# Altium footprint library Altium_Lib.PcbLib: 334 footprints (part 7 of 21)
Each footprint in its own frame and in the unit in brackets; x right, y up, seen from the top. Pads: shape width x height; smd on the part's side, far side on the other; paste and mask are expansions set on the pad; w line width, h text height; cw(c..) or ccw(c..) is an arc to the next point about the centre after c.
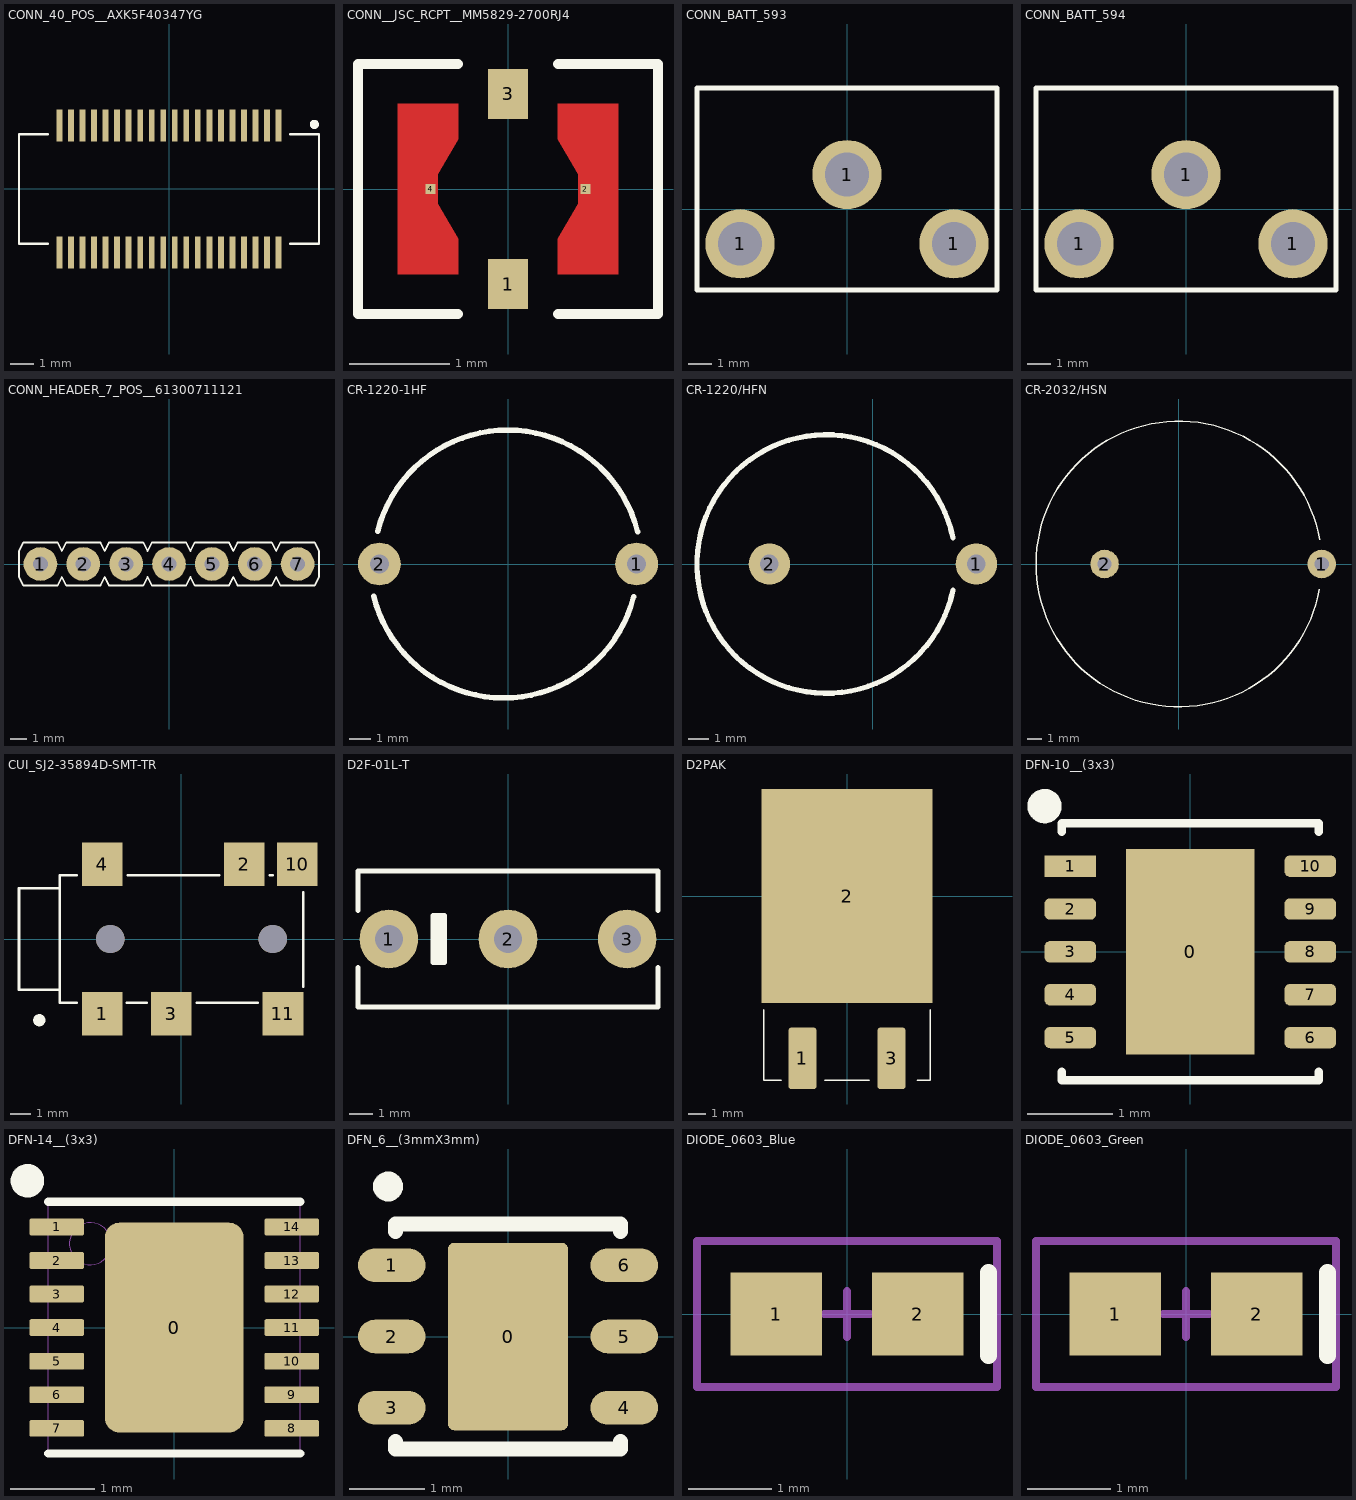
[diagram p6: the footprints below, top view; thin cyan lines are the x and y axes]

## CONN_40_POS__AXK5F40347YG [mm]
pads (40):
  rect 0.25x1.4 smd: 1(4.75,2.75) 2(4.25,2.75) 3(3.75,2.75) 4(3.25,2.75) 5(2.75,2.75) 6(2.25,2.75) 7(1.75,2.75) 8(1.25,2.75) 9(0.75,2.75) 10(0.25,2.75) 11(-0.25,2.75) 12(-0.75,2.75) 13(-1.25,2.75) 14(-1.75,2.75) 15(-2.25,2.75) 16(-2.75,2.75) 17(-3.25,2.75) 18(-3.75,2.75) 19(-4.25,2.75) 20(-4.75,2.75) 21(-4.75,-2.75) 22(-4.25,-2.75) 23(-3.75,-2.75) 24(-3.25,-2.75) 25(-2.75,-2.75) 26(-2.25,-2.75) 27(-1.75,-2.75) 28(-1.25,-2.75) 29(-0.75,-2.75) 30(-0.25,-2.75) 31(0.25,-2.75) 32(0.75,-2.75) 33(1.25,-2.75) 34(1.75,-2.75) 35(2.25,-2.75) 36(2.75,-2.75) 37(3.25,-2.75) 38(3.75,-2.75) 39(4.25,-2.75) 40(4.75,-2.75)
Top Overlay:
  circle w0.2: c6.3,2.8 r0.1
  lines w0.1: -5.25,-2.375 -6.5,-2.375 -6.5,2.375 -5.25,2.375 ; 5.25,-2.375 6.5,-2.375 6.5,2.375 5.25,2.375
3D body "47733.stp": height 1.45, standoff 0, extent -6.3,-3 6.3,3

## CONN__JSC_RCPT__MM5829-2700RJ4 [mm]
pads (4):
  rect 0.4x0.5 smd: 1(0,-0.95) 3(0,0.95)
  rect 0.1x0.1 smd: 2(0.775,0) 4(-0.775,0)
Top Layer:
  region: 0.5,-0.5 0.5,-0.85 1.1,-0.85 1.1,0.85 0.5,0.85 0.5,0.5 0.7,0.15 0.7,-0.15
  region: -0.5,0.5 -0.5,0.85 -1.1,0.85 -1.1,-0.85 -0.5,-0.85 -0.5,-0.5 -0.7,-0.15 -0.7,0.15
Top Overlay:
  lines w0.1: -0.5,-1.25 -1.5,-1.25 -1.5,1.25 -0.5,1.25 ; 0.5,-1.25 1.5,-1.25 1.5,1.25 0.5,1.25
Top Paste:
  region: -1.102,0.7 -0.7,0.7 -0.7,-0.701 -1.102,-0.701
  region: 0.701,0.7 1.1,0.7 1.1,-0.701 0.701,-0.701
  region: -0.15,1.1 0.15,1.1 0.15,0.751 -0.15,0.751
  region: -0.15,-0.75 0.15,-0.75 0.15,-1.102 -0.15,-1.102
Top Solder:
  region: -1.103,0.85 -0.45,0.85 -0.45,-0.852 -1.103,-0.852
  region: 0.451,0.85 1.1,0.85 1.1,-0.851 0.451,-0.851
  region: -0.251,1.2 0.25,1.2 0.25,0.652 -0.251,0.652
  region: -0.25,-0.65 0.25,-0.65 0.25,-1.202 -0.25,-1.202
3D body "User Library-1909763-1.STEP": height 1.28, standoff 0, extent -1.5,-1.55 1.5,1.3

## CONN_BATT_593 [mm]
pads (3):
  round 3 hole 1.9: 1(-4.635,-1.5) 1(0,1.5) 1(4.635,-1.5)
Top Overlay:
  lines w0.2: -6.5,-3.5 6.5,-3.5 6.5,-0.25 6.5,5.25 -6.5,5.25 -6.5,0.5 -6.5,-3.5
3D body "User Library-593.STEP": height 14.16, standoff -2.86, extent -4.85,-2.196 4.802,5.196

## CONN_BATT_594 [mm]
pads (3):
  round 3 hole 1.9: 1(-4.635,-1.5) 1(0,1.5) 1(4.635,-1.5)
Top Overlay:
  lines w0.2: -6.5,-3.5 6.5,-3.5 6.5,-0.25 6.5,5.25 -6.5,5.25 -6.5,0.5 -6.5,-3.5
3D body "User Library-594.STEP": height 14.16, standoff -2.86, extent -4.825,-2.308 4.827,5.108

## CONN_HEADER_7_POS__61300711121 [mm]
pads (7):
  round 2 hole 0.9 mask+0.05: 1(-7.62,0) 2(-5.08,0) 3(-2.54,0) 4(0,0) 5(2.54,0) 6(5.08,0) 7(7.62,0)
Top Overlay:
  lines w0.1: -8.89,-0.762 -8.89,0.762 -8.636,1.27 -6.604,1.27 -6.35,0.762 -6.096,1.27 -4.064,1.27 -3.81,0.762 -3.556,1.27 -1.524,1.27 -1.27,0.762 -1.016,1.27 1.016,1.27 1.27,0.762 1.524,1.27 3.556,1.27 3.81,0.762 4.064,1.27 6.096,1.27 6.35,0.762 6.604,1.27 8.636,1.27 8.89,0.762 8.89,-0.762 8.636,-1.27 6.604,-1.27 6.35,-0.762 6.096,-1.27 4.064,-1.27 3.81,-0.762 3.556,-1.27 1.524,-1.27 1.27,-0.762 1.016,-1.27 -1.016,-1.27 -1.27,-0.762 -1.524,-1.27 -3.556,-1.27 -3.81,-0.762 -4.064,-1.27 -6.096,-1.27 -6.35,-0.762 -6.604,-1.27 -8.636,-1.27 -8.89,-0.762
3D body "61300711121 (rev1).stp": height 8.57, standoff -2.97, extent -8.89,-1.27 8.89,1.27

## CR-1220-1HF [mm]
pads (2):
  round 2 hole 0.9: 1(6,0) 2(-6,0)
Top Overlay:
  lines w0.254: -6.266,-1.504 ccw(c-0.2,0) 5.86,-1.528 ; -6.08,1.528 cw(c-0.02,0) 6.046,1.504
3D body "CR1220 1HF.STEP": height 4.2, standoff -2.2, extent -6.625,-6.3 6.075,6.2

## CR-1220/HFN [mm]
pads (2):
  round 2 hole 0.9: 1(5,0) 2(-5,0)
Top Overlay:
  lines w0.254: 3.869,-1.275 cw(c-2.25,0) 3.869,1.275
3D body "User Library-CR1220-1.STEP": height 4.2, standoff -3.7, extent -8.5,-6.25 5.2,6.25

## CR-2032/HSN [mm]
pads (2):
  round 2 hole 1: 1(10,0) 2(-5.2,0)
Top Overlay:
  lines w0.1: 9.843,-1.767 cw(c0,0) 9.855,1.699
3D body "User Library-Battery, CR2032.STEP": height 5.67, standoff 2.49, extent -10.008,-10.008 10.008,10.008

## CUI_SJ2-35894D-SMT-TR [mm]
pads (8):
  rect 2x2.15 smd: 1(-3.9,-3.675) 2(3.1,3.675) 3(-0.5,-3.675) 4(-3.9,3.675) 10(5.7,3.675) 11(5,-3.675)
  round 1.4 hole 1.4 unplated: ""(-3.5,0) ""(4.5,0)
Top Overlay:
  circle w0.3: c-7,-4 r0.15
  lines w0.127: -5.15,-3.15 -6,-3.15 -6,-2.5 ; -5.15,3.15 -6,3.15 -6,2.5 ; -2.7,-3.15 -1.7,-3.15 ; -2.65,3.15 1.85,3.15 ; 0.75,-3.15 3.75,-3.15 ; 4.35,3.15 4.5,3.15 ; 6,-2.35 6,2.3 ; -6,-2.5 -8,-2.5 -8,2.5 -6,2.5 ; -6,-2.5 -6,2.5
3D body "54-00178.STEP": height 4.37, standoff -0.63, extent -7.959,-3.996 6.041,4.304

## D2F-01L-T [mm]
pads (3):
  round 2.5 hole 1.2: 1(-5.08,0) 2(0,0) 3(5.08,0)
Top Overlay:
  region: -3.2,1 -2.7,1 -2.7,-0.9 -2.8,-1 -3.2,-1
  lines w0.2: -6.4,-1.2 -6.4,-2.9 6.4,-2.9 6.4,-1.2 ; -6.4,1.2 -6.4,2.9 6.4,2.9 6.4,1.2 ; -3.2,-1 -3.2,1 -2.7,1 -2.7,-1 -3.2,-1
3D body "20106.stp": height 11.6, standoff -3.3, extent -6.4,-2.9 6.734,2.9

## D2PAK [mm]
pads (3):
  rrect20% 1.6x3.5 smd mask+0.05: 1(-2.54,-9.25) 3(2.54,-9.25)
  rect 9.75x12.2 smd mask+0.05: 2(0,0)
Top Overlay:
  lines w0.1: -4.75,-6.5 -4.75,-10.5 -3.75,-10.5 ; -1.25,-10.5 1.25,-10.5 ; 4,-10.5 4.75,-10.5 4.75,-6.5
3D body "SW3dPS-DPAK.STEP": height 4.98, standoff -0.03, extent -5.08,-10.633 5.08,4.631

## DFN-10__(3x3) [mm]
pads (11):
  rect 1.5x2.4 smd mask+0.05: 0(0,0)
  rect 0.6x0.25 smd mask+0.05: 1(-1.4,1)
  rrect50% 0.6x0.25 smd mask+0.05: 2(-1.4,0.5) 3(-1.4,0) 4(-1.4,-0.5) 5(-1.4,-1) 6(1.4,-1) 7(1.4,-0.5) 8(1.4,0) 9(1.4,0.5) 10(1.4,1)
Top Overlay:
  circle w0.2: c-1.7,1.7 r0.1
  lines w0.1: -1.5,-1.4 -1.5,-1.5 1.3,-1.5 1.5,-1.5 1.5,-1.4 ; -1.5,1.4 -1.5,1.5 -1.1,1.5 1.5,1.5 1.5,1.4
3D body "User Library-My-DFN-10-3x3-0_5.STEP": height 0.8, standoff 0, extent -1.56,-1.55 1.56,1.55

## DFN-14__(3x3) [mm]
pads (15):
  rrect20% 1.65x2.5 smd mask+0.05: 0(0,0)
  rrect20% 0.65x0.2 smd mask+0.05: 1(-1.4,1.2) 2(-1.4,0.8) 3(-1.4,0.4) 4(-1.4,0) 5(-1.4,-0.4) 6(-1.4,-0.8) 7(-1.4,-1.2) 8(1.4,-1.2) 9(1.4,-0.8) 10(1.4,-0.4) 11(1.4,0) 12(1.4,0.4) 13(1.4,0.8) 14(1.4,1.2)
Top Overlay:
  circle w0.2: c-1.75,1.75 r0.1
  lines w0.1: -1.5,-1.5 1.5,-1.5 ; -1.5,1.5 1.5,1.5
Mechanical 15:
  circle w0.01: c-1,1 r0.25
  lines w0.01: -1.5,-1.5 1.5,-1.5 1.5,1.5 -1.5,1.5 -1.5,-1.5
3D body: height 0.79, standoff 0, extent -1.249,0.751 -0.751,1.249
3D body: height 0.75, standoff 0, extent -1.499,-1.499 1.499,1.499

## DFN_6__(3mmX3mm) [mm]
pads (7):
  rrect10% 1.6x2.5 smd mask+0.05: 0(0,0)
  rrect100% 0.9x0.45 smd mask+0.05: 1(-1.55,0.95) 2(-1.55,0) 3(-1.55,-0.95) 4(1.55,-0.95) 5(1.55,0) 6(1.55,0.95)
Top Overlay:
  circle w0.2: c-1.6,2 r0.1
  lines w0.2: -1.5,-1.4 -1.5,-1.5 1.5,-1.5 1.5,-1.4 ; -1.5,1.4 -1.5,1.5 1.5,1.5 1.5,1.4
3D body "User Library-dfn6_3x3_rm0_95.STEP": height 0.8, standoff 0, extent -1.55,-1.5 1.55,1.5

## DIODE_0603_Blue [mm] "Chip Resistor; Body 1.6 x 0.8 mm (LxW typ)"
height 0.85
pads (2):
  rect 1.1x1 smd: 1(-0.85,0) 2(0.85,0)
Top Overlay:
  lines w0.203: 1.7,-0.5 1.7,0.5
Mechanical 15:
  lines w0.1: -0.275,0 0.275,0 ; 0,-0.275 0,0.275 ; -1.8,-0.875 1.8,-0.875 1.8,0.875 -1.8,0.875 -1.8,-0.875
3D body "LED_0603_Blue.step": height 0.6, standoff 0, extent -0.81,-0.4 0.81,0.4

## DIODE_0603_Green [mm] "Chip Resistor; Body 1.6 x 0.8 mm (LxW typ)"
height 0.85
pads (2):
  rect 1.1x1 smd: 1(-0.85,0) 2(0.85,0)
Top Overlay:
  lines w0.203: 1.7,-0.5 1.7,0.5
Mechanical 15:
  lines w0.1: -0.275,0 0.275,0 ; 0,-0.275 0,0.275 ; -1.8,-0.875 1.8,-0.875 1.8,0.875 -1.8,0.875 -1.8,-0.875
3D body "LED_0603_Green.step": height 0.6, standoff 0, extent -0.81,-0.4 0.81,0.4